# Altium integrated library Cap-Cer-SMD_V2.IntLib: 957 symbols (part 2 of 7) (continued)
## 3.3uF_1210N_16V_10%_X7R
designator C?  value 3.3uF  Voltage: 16V  Text1: 1210  (hidden comment: 3.3uF_1210N_16V_10%_X7R)
Cap Ceramic X7R; Manufacturer: Various; Part Number: 3.3uF 1210N 16V 10% X7R; EDM-PN: CAP1390; Tol: 10%; Package: CAPC1210X180N; Text2: *; SAAB PN: *; DCE Part No: *
footprint CAPC1210X180N (Chip Capacitor, 1210, 2-Leads, Body 3.2x2.5mm, IPC Medium Density)
pins: 1, 2

## 3.3uF_1210N_50V_10%_X7R
designator C?  value 3.3uF  Voltage: 50V  Text1: 1210  (hidden comment: 3.3uF_1210N_50V_10%_X7R)
Cap Ceramic X7R; Manufacturer: Various; Part Number: 3.3uF 1210N 50V 10% X7R; Tol: 10%; Package: CAPC1210X180N; EDM-PN: *; Text2: *; SAAB PN: *; DCE Part No: *
footprint CAPC1210X180N (Chip Capacitor, 1210, 2-Leads, Body 3.2x2.5mm, IPC Medium Density)
pins: 1, 2

## 3.6pF_0402N_50V_0.5pF_C0G/NP0
designator C?, comment value 3.6pF  Voltage: 50V  Text1: 0402  (hidden comment: 3.6pF_C0402_50V_0.5pF_C0G/NP0)
Cap Ceramic C0G/NP0; Manufacturer: Various; Part Number: 3.6pF 0402 50V 0.5pF C0G/NP0; EDM-PN: CAP934; Tol: 0.5pF; Package: CAPC0402X60N; Text2: *; SAAB PN: *; DCE Part No: *
footprint CAPC0402X60N (Chip Capacitor, 0402, 2-Leads, Body 1.0x0.5mm, IPC Medium Density)
pins: 1, 2

## 3.6pF_0603N_250V_0.1pF_C0G/NP0
designator C?, comment value 3.6pF  Voltage: 250V  Text1: 0603  (hidden comment: 251R14S3R6BV4T)
Cap Ceramic C0G/NP0; Manufacturer: Johanson; EDM-PN: CAP1326; Tol: 0.1pF; Part Number: 251R14S3R6BV4T; Package: CAPC0603X85N; Text2: *; SAAB PN: *; DCE Part No: *
footprint CAPC0603X85N (Chip Capacitor, 0603, 2-Leads, Body 1.6x0.8mm, IPC Medium Density)
pins: 1, 2

## 3.9nF_0402N_50V_10%_X7R
designator C?, comment value 3.9nF  Voltage: 50V  Text1: 0402  (hidden comment: 3.9nF_C0402_50V_10%_X7R)
Cap Ceramic X7R; Manufacturer: Various; Part Number: 3.9nF 0402 50V 10% X7R; Tol: 10%; Package: CAPC0402X60N; EDM-PN: *; Text2: *; SAAB PN: *; DCE Part No: *
footprint CAPC0402X60N (Chip Capacitor, 0402, 2-Leads, Body 1.0x0.5mm, IPC Medium Density)
pins: 1, 2

## 3.9nF_0603N_50V_5%_C0G/NP0
designator C?, comment value 3.9nF  Voltage: 50V  Text1: 0603  (hidden comment: 3.9nF_C0603_50V_5%_C0G/NP0)
Cap Ceramic C0G/NP0; Manufacturer: Various; Part Number: 3.9nF 0603 50V 5% C0G/NP0; EDM-PN: CAP1300; Tol: 5%; Package: CAPC0603X85N; Text2: *; SAAB PN: *; DCE Part No: *
footprint CAPC0603X85N (Chip Capacitor, 0603, 2-Leads, Body 1.6x0.8mm, IPC Medium Density)
pins: 1, 2

## 3.9nF_0603N_50V_10%_X7R
designator C?, comment value 3.9nF  Voltage: 50V  Text1: 0603  (hidden comment: 3.9nF_C0603_50V_10%_X7R)
Cap Ceramic X7R; Manufacturer: Various; Part Number: 3.9nF 0603 50V 10% X7R; Tol: 10%; Package: CAPC0603X85N; EDM-PN: *; Text2: *; SAAB PN: *; DCE Part No: *
footprint CAPC0603X85N (Chip Capacitor, 0603, 2-Leads, Body 1.6x0.8mm, IPC Medium Density)
pins: 1, 2

## 3.9nF_0805N_50V_10%_X7R
designator C?, comment value 3.9nF  Voltage: 50V  Text1: 0805  (hidden comment: 3.9nF_C0805_50V_10%_X7R)
Cap Ceramic X7R; Manufacturer: Various; Part Number: 3.9nF 0805 50V 10% X7R; Tol: 10%; Package: CAPC0805X110N; EDM-PN: *; Text2: *; SAAB PN: *; DCE Part No: *
footprint CAPC0805X110N (Chip Capacitor, 0805, 2-Leads, Body 2.0x1.3mm, IPC Medium Density)
pins: 1, 2

## 3.9pF_0402N_50V_5%_C0G/NP0
designator C?, comment value 3.9pF  Voltage: 50V  Text1: 0402  (hidden comment: 3.9pF_C0402_50V_5%_C0G/NP0)
Cap Ceramic C0G/NP0; Manufacturer: Various; Part Number: 3.9pF 0402 50V 5% C0G; Tol: 5%; Package: CAPC0402X60N; EDM-PN: *; Text2: *; SAAB PN: *; DCE Part No: *
footprint CAPC0402X60N (Chip Capacitor, 0402, 2-Leads, Body 1.0x0.5mm, IPC Medium Density)
pins: 1, 2

## 3.9pF_0603N_50V_5%_C0G/NP0
designator C?, comment value 3.9pF  Voltage: 50V  Text1: 0603  (hidden comment: 3.9pF_C0603_50V_5%_C0G/NP0)
Cap Ceramic C0G/NP0; Manufacturer: Various; Part Number: 3.9pF 0603 50V 5% C0G/NP0; Tol: 5%; Package: CAPC0603X85N; EDM-PN: *; Text2: *; SAAB PN: *; DCE Part No: *
footprint CAPC0603X85N (Chip Capacitor, 0603, 2-Leads, Body 1.6x0.8mm, IPC Medium Density)
pins: 1, 2

## 3.9pF_0805N_50V_5%_C0G/NP0
designator C?, comment value 3.9pF  Voltage: 50V  Text1: 0805  (hidden comment: 3.9pF_C0805_50V_5%_C0G/NP0)
Cap Ceramic C0G/NP0; Manufacturer: Various; Part Number: 3.9pF 0805 50V 5% C0G/NP0; Tol: 5%; Package: CAPC0805X110N; EDM-PN: *; Text2: *; SAAB PN: *; DCE Part No: *
footprint CAPC0805X110N (Chip Capacitor, 0805, 2-Leads, Body 2.0x1.3mm, IPC Medium Density)
pins: 1, 2

## 3pF_0402N_50V_0.25pF_C0G/NP0
designator C?, comment value 3pF  Voltage: 50V  Text1: 0402  (hidden comment: 3pF_C0402_50V_0.25p_C0G/NP0)
Cap Ceramic C0G/NP0; Manufacturer: Various; Part Number: 3pF 0402 50V 0.25pF C0G/NP0; EDM-PN: CAP935; Tol: 0.25pF; Package: CAPC0402X60N; Text2: *; SAAB PN: *; DCE Part No: *
footprint CAPC0402X60N (Chip Capacitor, 0402, 2-Leads, Body 1.0x0.5mm, IPC Medium Density)
pins: 1, 2

## 3pF_0402N_50V_0.25pF_C0G/NP0-GRM1555C
designator C?, comment value 3pF  Voltage: 50V  Text1: 0402  (hidden comment: GRM1555C1H3R0CA01D)
Cap Ceramic C0G/NP0; Manufacturer: Murata; Tol: 0.25pF; Part Number: GRM1555C1H3R0CA01D; Package: GRM155-0.20; EDM-PN: *; Text2: *; SAAB PN: *; DCE Part No: *
footprint GRM155-0.20 (GRM155 0402 1.0x0.5mm)
pins: 1, 2

## 3pF_0603N_200V_0.1pF_C0G/NP0-06032U3R0BAT2A
designator C?, comment value 3pF  Voltage: 200V  Text1: 0603  (hidden comment: 06032U3R0BAT2A)
Cap Ceramic C0G/NP0; Manufacturer: AVX; EDM-PN: CAP1248; Tol: 0.1pF; Part Number: 06032U3R0BAT2A; Package: CAPC0603X85N; Text2: *; SAAB PN: *; DCE Part No: *
footprint CAPC0603X85N (Chip Capacitor, 0603, 2-Leads, Body 1.6x0.8mm, IPC Medium Density)
pins: 1, 2

## 4.3pF_0402N_50V_5%_C0G/NP0
designator C?, comment value 4.3pF  Voltage: 50V  Text1: 0402  (hidden comment: 4.3pF_C0402_50V_5%_C0G/NP0)
Cap Ceramic C0G/NP0; Manufacturer: Various; Part Number: 4.3pF 0402 50V 5% C0G/NP0; Tol: 5%; Package: CAPC0402X60N; EDM-PN: *; Text2: *; SAAB PN: *; DCE Part No: *
footprint CAPC0402X60N (Chip Capacitor, 0402, 2-Leads, Body 1.0x0.5mm, IPC Medium Density)
pins: 1, 2

## 4.3pF_0603N_50V_5%_C0G/NP0
designator C?, comment value 4.3pF  Voltage: 50V  Text1: 0603  (hidden comment: 4.3pF_C0603_50V_5%_C0G/NP0)
Cap Ceramic C0G/NP0; Manufacturer: Various; Part Number: 4.3pF 0603 50V 5% C0G/NP0; EDM-PN: CAP1350; Tol: 5%; Package: CAPC0603X85N; Text2: *; SAAB PN: *; DCE Part No: *
footprint CAPC0603X85N (Chip Capacitor, 0603, 2-Leads, Body 1.6x0.8mm, IPC Medium Density)
pins: 1, 2

## 4.3pF_0805N_50V_5%_C0G/NP0
designator C?, comment value 4.3pF  Voltage: 50V  Text1: 0805  (hidden comment: 4.3pF_C0805_50V_5%_C0G/NP0)
Cap Ceramic C0G/NP0; Manufacturer: Various; Part Number: 4.3pF 0805 50V 5% C0G/NP0; Tol: 5%; Package: CAPC0805X110N; EDM-PN: *; Text2: *; SAAB PN: *; DCE Part No: *
footprint CAPC0805X110N (Chip Capacitor, 0805, 2-Leads, Body 2.0x1.3mm, IPC Medium Density)
pins: 1, 2

## 4.7nF_0201N_10V_10%_X5R
designator C?, comment value 4.7nF  Voltage: 10V  Text1: 0201  (hidden comment: 4.7nF_C0201_10V_10%_X5R)
Cap Ceramic X5R; Manufacturer: Various; Part Number: 4.7nF 0201 10V 10%_X5R; Tol: 10%; Package: CAPC0201X33N; EDM-PN: *; Text2: *; SAAB PN: *; DCE Part No: *
footprint CAPC0201X33N (Chip Capacitor, 0201, 2-Leads, Body 0.6x0.3mm, IPC Medium Density)
pins: 1, 2

## 4.7nF_0402N_50V_10%_X7R
designator C?, comment value 4.7nF  Voltage: 50V  Text1: 0402  (hidden comment: 4.7nF_C0402_50V_10%_X7R)
Cap Ceramic X7R; Manufacturer: Various; Part Number: 4.7nF 0402 50V 10% X7R; EDM-PN: CAP1039; Tol: 10%; Package: CAPC0402X60N; Text2: *; SAAB PN: *; DCE Part No: *
footprint CAPC0402X60N (Chip Capacitor, 0402, 2-Leads, Body 1.0x0.5mm, IPC Medium Density)
pins: 1, 2

## 4.7nF_0603N_50V_5%_X7R
designator C?, comment value 4.7nF  Voltage: 50V  Text1: 0603  (hidden comment: 4.7nF_C0603_50V_5%_X7R)
Cap Ceramic X7R; Manufacturer: Various; Part Number: 4.7nF 0603 50V 5% X7R; Tol: 5%; Reutech PN: 5910-CA-0464; Package: CAPC0603X85N; EDM-PN: *; Text2: *; SAAB PN: *; DCE Part No: *
footprint CAPC0603X85N (Chip Capacitor, 0603, 2-Leads, Body 1.6x0.8mm, IPC Medium Density)
pins: 1, 2

## 4.7nF_0603N_50V_10%_X7R
designator C?, comment value 4.7nF  Voltage: 50V  Text1: 0603  (hidden comment: 4.7nF_C0603_50V_10%_X7R)
Cap Ceramic X7R; Manufacturer: Various; Part Number: 4.7nF 0603 50V 10% X7R; Tol: 10%; Package: CAPC0603X85N; EDM-PN: *; Text2: *; SAAB PN: *; DCE Part No: *
footprint CAPC0603X85N (Chip Capacitor, 0603, 2-Leads, Body 1.6x0.8mm, IPC Medium Density)
pins: 1, 2

## 4.7nF_0603N_50V_10%_X7R-DNF
designator C?, comment value (4.7nF)  Voltage: 50V  Text1: 0603  (hidden comment: 4.7nF_C0603_50V_10%_X7R)
Cap Ceramic X7R - Do not Fit; Manufacturer: Various; Part Number: DNF - 4.7nF 0603 50V 10% X7R; Tol: 10%; Package: CAPC0603X85N; EDM-PN: *; Text2: *; SAAB PN: *; DCE Part No: *
footprint CAPC0603X85N (Chip Capacitor, 0603, 2-Leads, Body 1.6x0.8mm, IPC Medium Density)
pins: 1, 2

## 4.7nF_0603N_100V_5%_X7R
designator C?, comment value 4.7nF  Voltage: 100V  Text1: 0603  (hidden comment: 4.7nF_C0603_100V_5%_X7R)
Cap Ceramic X7R; Manufacturer: Various; Part Number: 4.7nF 0603 100V 5% X7R; Tol: 5%; Package: CAPC0603X85N; EDM-PN: *; Text2: *; SAAB PN: *; DCE Part No: *
footprint CAPC0603X85N (Chip Capacitor, 0603, 2-Leads, Body 1.6x0.8mm, IPC Medium Density)
pins: 1, 2

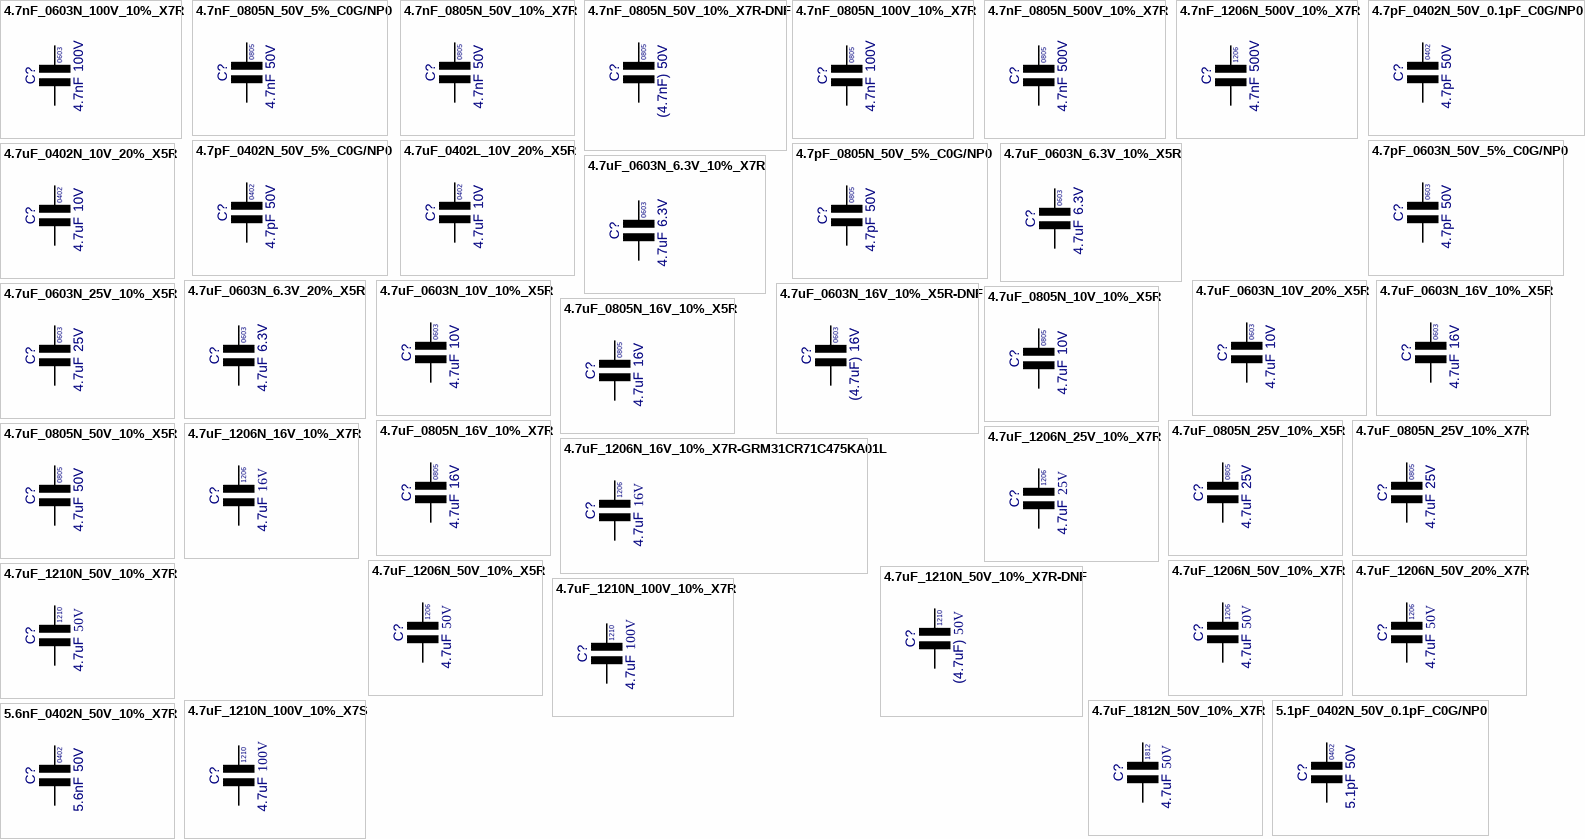
[diagram p6: symbols 4.7nF_0603N_100V_10%_X7R to 5.6nF_0402N_50V_10%_X7R]

## 4.7nF_0603N_100V_10%_X7R
designator C?, comment value 4.7nF  Voltage: 100V  Text1: 0603  (hidden comment: 4.7nF_C0603_100V_10%_X7R)
Cap Ceramic X7R; Manufacturer: Various; Part Number: 4.7nF 0603 100V 10% X7R; Tol: 10%; Package: CAPC0603X85N; EDM-PN: *; Text2: *; SAAB PN: *; DCE Part No: *
footprint CAPC0603X85N (Chip Capacitor, 0603, 2-Leads, Body 1.6x0.8mm, IPC Medium Density)
pins: 1, 2

## 4.7nF_0805N_50V_5%_C0G/NP0
designator C?, comment value 4.7nF  Voltage: 50V  Text1: 0805  (hidden comment: 4.7nF_C0805_50V_5%_C0G/NP0)
Cap Ceramic C0G/NP0; Manufacturer: Various; Part Number: 4.7nF 0805 50V 5% C0G/NP0; Tol: 5%; Package: CAPC0805X110N; EDM-PN: *; Text2: *; SAAB PN: *; DCE Part No: *
footprint CAPC0805X110N (Chip Capacitor, 0805, 2-Leads, Body 2.0x1.3mm, IPC Medium Density)
pins: 1, 2

## 4.7nF_0805N_50V_10%_X7R
designator C?, comment value 4.7nF  Voltage: 50V  Text1: 0805  (hidden comment: 4.7nF_C0805_50V_10%_X7R)
Cap Ceramic X7R; Manufacturer: Various; Part Number: 4.7nF 0805 50V 10% X7R; Tol: 10%; Package: CAPC0805X110N; EDM-PN: *; Text2: *; SAAB PN: *; DCE Part No: *
footprint CAPC0805X110N (Chip Capacitor, 0805, 2-Leads, Body 2.0x1.3mm, IPC Medium Density)
pins: 1, 2

## 4.7nF_0805N_50V_10%_X7R-DNF
designator C?, comment value (4.7nF)  Voltage: 50V  Text1: 0805  (hidden comment: 4.7nF_C0805_50V_10%_X7R-DNF)
Cap Ceramic X7R - Do not Fit; Manufacturer: Various; Part Number: DNF  - 4.7nF 0805 50V 10% X7R; Tol: 10%; Package: CAPC0805X110N; EDM-PN: *; Text2: *; SAAB PN: *; DCE Part No: *
footprint CAPC0805X110N (Chip Capacitor, 0805, 2-Leads, Body 2.0x1.3mm, IPC Medium Density)
pins: 1, 2

## 4.7nF_0805N_100V_10%_X7R
designator C?, comment value 4.7nF  Voltage: 100V  Text1: 0805  (hidden comment: 4.7nF_C0805_100V_10%_X7R)
Cap Ceramic X7R; Manufacturer: Various; Part Number: 4.7nF 0805 100V 10% X7R; Tol: 10%; Package: CAPC0805X110N; EDM-PN: *; Text2: *; SAAB PN: *; DCE Part No: *
footprint CAPC0805X110N (Chip Capacitor, 0805, 2-Leads, Body 2.0x1.3mm, IPC Medium Density)
pins: 1, 2

## 4.7nF_0805N_500V_10%_X7R
designator C?, comment value 4.7nF  Voltage: 500V  Text1: 0805  (hidden comment: 4.7nF_C0805_500V_10%_X7R)
Cap Ceramic X7R; Manufacturer: Various; Part Number: 4.7nF 0805 500V 10% X7R; Tol: 10%; Package: CAPC0805X110N; EDM-PN: *; Text2: *; SAAB PN: *; DCE Part No: *
footprint CAPC0805X110N (Chip Capacitor, 0805, 2-Leads, Body 2.0x1.3mm, IPC Medium Density)
pins: 1, 2

## 4.7nF_1206N_500V_10%_X7R
designator C?, comment value 4.7nF  Voltage: 500V  Text1: 1206  (hidden comment: 4.7nF_C1206_500V_10%_X7R)
Cap Ceramic X7R; Manufacturer: Various; Part Number: 4.7nF 1206 500V 10% X7R; Tol: 10%; Package: CAPC1206X135N; EDM-PN: *; Text2: *; SAAB PN: *; DCE Part No: *
footprint CAPC1206X135N (Chip Capacitor, 1206, 2-Leads, Body 3.2x1.6mm, IPC Medium Density)
pins: 1, 2

## 4.7pF_0402N_50V_0.1pF_C0G/NP0
designator C?, comment value 4.7pF  Voltage: 50V  Text1: 0402  (hidden comment: 4.7pF_C0402_50V_0.1pF_C0G/NP0)
Cap Ceramic C0G/NP0; Manufacturer: Various; Part Number: 4.7pF 0402 50V 0.1pF C0G/NP0; Tol: 0.1pF; Package: CAPC0402X60N; EDM-PN: *; Text2: *; SAAB PN: *; DCE Part No: *
footprint CAPC0402X60N (Chip Capacitor, 0402, 2-Leads, Body 1.0x0.5mm, IPC Medium Density)
pins: 1, 2

## 4.7pF_0402N_50V_5%_C0G/NP0
designator C?, comment value 4.7pF  Voltage: 50V  Text1: 0402  (hidden comment: 4.7pF_C0402_50V_5%_C0G/NP0)
Cap Ceramic C0G/NP0; Manufacturer: Various; Part Number: 4.7pF 0402 50V 5% C0G/NP0; Tol: 5%; Package: CAPC0402X60N; EDM-PN: *; Text2: *; SAAB PN: *; DCE Part No: *
footprint CAPC0402X60N (Chip Capacitor, 0402, 2-Leads, Body 1.0x0.5mm, IPC Medium Density)
pins: 1, 2

## 4.7pF_0603N_50V_5%_C0G/NP0
designator C?, comment value 4.7pF  Voltage: 50V  Text1: 0603  (hidden comment: 4.7pF_C0603_50V_5%_C0G/NP0)
Cap Ceramic C0G/NP0; Manufacturer: Various; Part Number: 4.7pF 0603 50V 5% C0G/NP0; EDM-PN: CAP844; Tol: 5%; Package: CAPC0603X85N; Text2: *; SAAB PN: *; DCE Part No: *
footprint CAPC0603X85N (Chip Capacitor, 0603, 2-Leads, Body 1.6x0.8mm, IPC Medium Density)
pins: 1, 2

## 4.7pF_0805N_50V_5%_C0G/NP0
designator C?, comment value 4.7pF  Voltage: 50V  Text1: 0805  (hidden comment: 4.7pF_C0805_50V_5%_C0G/NP0)
Cap Ceramic C0G/NP0; Manufacturer: Various; Part Number: 4.7pF 0805 50V 5% C0G/NP0; Tol: 5%; Package: CAPC0805X110N; EDM-PN: *; Text2: *; SAAB PN: *; DCE Part No: *
footprint CAPC0805X110N (Chip Capacitor, 0805, 2-Leads, Body 2.0x1.3mm, IPC Medium Density)
pins: 1, 2

## 4.7uF_0402L_10V_20%_X5R
designator C?, comment value 4.7uF  Voltage: 10V  Text1: 0402  (hidden comment: 4.7uF_C0402_10V_20%_X5R)
Cap Ceramic X5R; Manufacturer: Samsung; Part Number: CL05A475MP5NRNC; DCE Part No: 9509; EDM-PN: CAP1029; Tol: 20%; Package: CAPC0402X60L; Text2: *; SAAB PN: *
footprint CAPC0402X60L (Chip Capacitor, 0402, 2-Leads, Body 1.0x0.5mm, IPC High Density)
pins: 1, 2

## 4.7uF_0402N_10V_20%_X5R
designator C?, comment value 4.7uF  Voltage: 10V  Text1: 0402  (hidden comment: 4.7uF_C0402_10V_20%_X5R)
Cap Ceramic X5R; Manufacturer: Samsung; Part Number: CL05A475MP5NRNC; DCE Part No: 9509; EDM-PN: CAP1029; Tol: 20%; Package: CAPC0402X60N; Text2: *; SAAB PN: *
footprint CAPC0402X60N (Chip Capacitor, 0402, 2-Leads, Body 1.0x0.5mm, IPC Medium Density)
pins: 1, 2

## 4.7uF_0603N_6.3V_10%_X5R
designator C?, comment value 4.7uF  Voltage: 6.3V  Text1: 0603  (hidden comment: 4.7uF_C0603_6.3V_10%_X5R)
Cap Ceramic X5R; Manufacturer: Various; Part Number: 4.7uF 0603 6.3V 10% X5R; DCE Part No: 9510; Tol: 20%; Reutech PN: 5910-CA-0531; Package: CAPC0603X85N; EDM-PN: *; Text2: *; SAAB PN: *
footprint CAPC0603X85N (Chip Capacitor, 0603, 2-Leads, Body 1.6x0.8mm, IPC Medium Density)
pins: 1, 2

## 4.7uF_0603N_6.3V_10%_X7R
designator C?, comment value 4.7uF  Voltage: 6.3V  Text1: 0603  (hidden comment: 4.7uF_C0603_6.3V_10%_X7R)
Cap Ceramic X7R; Manufacturer: Various; Part Number: 4.7uF 0603 6.3V 10% X7R; Tol: 20%; Reutech PN: 5910-CA-0531; Package: CAPC0603X85N; EDM-PN: *; Text2: *; SAAB PN: *; DCE Part No: *
footprint CAPC0603X85N (Chip Capacitor, 0603, 2-Leads, Body 1.6x0.8mm, IPC Medium Density)
pins: 1, 2

## 4.7uF_0603N_6.3V_20%_X5R
designator C?, comment value 4.7uF  Voltage: 6.3V  Text1: 0603  (hidden comment: 4.7uF_C0603_6.3V_20%_X5R)
Cap Ceramic X5R; Manufacturer: Various; Part Number: 4.7uF 0603 6.3V 20% X5R; EDM-PN: CAP1247; Tol: 20%; Package: CAPC0603X85N; Text2: *; SAAB PN: *; DCE Part No: *
footprint CAPC0603X85N (Chip Capacitor, 0603, 2-Leads, Body 1.6x0.8mm, IPC Medium Density)
pins: 1, 2

## 4.7uF_0603N_10V_10%_X5R
designator C?, comment value 4.7uF  Voltage: 10V  Text1: 0603  (hidden comment: 4.7uF_C0603_10V_10%_X5R)
Cap Ceramic X5R; Manufacturer: Various; Part Number: 4.7uF 0603 10V 10% X5R; DCE Part No: 9509; EDM-PN: CAP429; Tol: 10%; Package: CAPC0603X85N; Text2: *; SAAB PN: *
footprint CAPC0603X85N (Chip Capacitor, 0603, 2-Leads, Body 1.6x0.8mm, IPC Medium Density)
pins: 1, 2

## 4.7uF_0603N_10V_20%_X5R
designator C?, comment value 4.7uF  Voltage: 10V  Text1: 0603  (hidden comment: 4.7uF_C0603_10V_20%_X5R)
Cap Ceramic X5R; Manufacturer: Various; Part Number: 4.7uF 0603 10V 10% X5R; Tol: 20%; Package: CAPC0603X85N; EDM-PN: *; Text2: *; SAAB PN: *; DCE Part No: *
footprint CAPC0603X85N (Chip Capacitor, 0603, 2-Leads, Body 1.6x0.8mm, IPC Medium Density)
pins: 1, 2

## 4.7uF_0603N_16V_10%_X5R
designator C?, comment value 4.7uF  Voltage: 16V  Text1: 0603  (hidden comment: 4.7uF_C0603_16V_10%_X5R)
Cap Ceramic X5R; Manufacturer: Various; Part Number: 4.7uF 0603 16V 10% X5R; EDM-PN: CAP967; Tol: 10%; Package: CAPC0603X85N; Text2: *; SAAB PN: *; DCE Part No: *
footprint CAPC0603X85N (Chip Capacitor, 0603, 2-Leads, Body 1.6x0.8mm, IPC Medium Density)
pins: 1, 2

## 4.7uF_0603N_16V_10%_X5R-DNF
designator C?, comment value (4.7uF)  Voltage: 16V  Text1: 0603  (hidden comment: 4.7uF_C0603_16V_10%_X5R)
Cap Ceramic X5R - Do not Fit; Manufacturer: Various; Part Number: DNF - 4.7uF 0603 16V 10% X5R; EDM-PN: CAP967; Tol: 10%; Package: CAPC0603X85N; Text2: *; SAAB PN: *; DCE Part No: *
footprint CAPC0603X85N (Chip Capacitor, 0603, 2-Leads, Body 1.6x0.8mm, IPC Medium Density)
pins: 1, 2

## 4.7uF_0603N_25V_10%_X5R
designator C?, comment value 4.7uF  Voltage: 25V  Text1: 0603  (hidden comment: 4.7uF_C0603_25V_10%_X5R)
Cap Ceramic X5R; Manufacturer: Various; Part Number: 4.7uF 0603 25V 10% X5R; EDM-PN: CAP1302; Tol: 10%; Package: CAPC0603X85N; Text2: *; SAAB PN: *; DCE Part No: *
footprint CAPC0603X85N (Chip Capacitor, 0603, 2-Leads, Body 1.6x0.8mm, IPC Medium Density)
pins: 1, 2

## 4.7uF_0805N_10V_10%_X5R
designator C?, comment value 4.7uF  Voltage: 10V  Text1: 0805  (hidden comment: 4.7uF_C0805_10V_10%_X5R)
Cap Ceramic X5R; Manufacturer: Various; Part Number: 4.7uF 0805 10V 10% X5R; Tol: 10%; Reutech PN: 5910-CA-0468; Package: CAPC0805X110N; EDM-PN: *; Text2: *; SAAB PN: *; DCE Part No: *
footprint CAPC0805X110N (Chip Capacitor, 0805, 2-Leads, Body 2.0x1.3mm, IPC Medium Density)
pins: 1, 2

## 4.7uF_0805N_16V_10%_X5R
designator C?, comment value 4.7uF  Voltage: 16V  Text1: 0805  (hidden comment: 4.7uF_C0805_16V_10%_X5R)
Cap Ceramic X5R; Manufacturer: Various; Part Number: 4.7uF 0805 16V 10% X5R; EDM-PN: CAP220; Tol: 10%; Package: CAPC0805X110N; Text2: *; SAAB PN: *; DCE Part No: *
footprint CAPC0805X110N (Chip Capacitor, 0805, 2-Leads, Body 2.0x1.3mm, IPC Medium Density)
pins: 1, 2

## 4.7uF_0805N_16V_10%_X7R
designator C?, comment value 4.7uF  Voltage: 16V  Text1: 0805  (hidden comment: 4.7uF_C0805_16V_10%_X7R)
Cap Ceramic X7R; Manufacturer: Various; Part Number: 4.7uF 0805 16V 10% X7R; EDM-PN: CAP404; Tol: 10%; Package: CAPC0805X110N; Text2: *; SAAB PN: *; DCE Part No: *
footprint CAPC0805X110N (Chip Capacitor, 0805, 2-Leads, Body 2.0x1.3mm, IPC Medium Density)
pins: 1, 2

## 4.7uF_0805N_25V_10%_X5R
designator C?, comment value 4.7uF  Voltage: 25V  Text1: 0805  (hidden comment: 4.7uF_C0805_25V_10%_X5R)
Cap Ceramic X5R; Manufacturer: Various; Part Number: 4.7uF 0805 25V 10% X5R; Tol: 10%; Reutech PN: 5910-CA-0483; Package: CAPC0805X110N; EDM-PN: *; Text2: *; SAAB PN: *; DCE Part No: *
footprint CAPC0805X110N (Chip Capacitor, 0805, 2-Leads, Body 2.0x1.3mm, IPC Medium Density)
pins: 1, 2

## 4.7uF_0805N_25V_10%_X7R
designator C?, comment value 4.7uF  Voltage: 25V  Text1: 0805  (hidden comment: 4.7uF_C0805_25V_10%_X7R)
Cap Ceramic X7R; Manufacturer: Various; Part Number: 4.7uF 0805 25V 10% X7R; EDM-PN: CAP544; Tol: 10%; Package: CAPC0805X110N; Text2: *; SAAB PN: *; DCE Part No: *
footprint CAPC0805X110N (Chip Capacitor, 0805, 2-Leads, Body 2.0x1.3mm, IPC Medium Density)
pins: 1, 2

## 4.7uF_0805N_50V_10%_X5R
designator C?, comment value 4.7uF  Voltage: 50V  Text1: 0805  (hidden comment: 4.7uF_C0805_50V_10%_X5R)
Cap Ceramic X5R; Manufacturer: Various; Part Number: 4.7uF 0805 50V 10% X5R; EDM-PN: CAP787; Tol: 10%; Package: CAPC0805X110N; Text2: *; SAAB PN: *; DCE Part No: *
footprint CAPC0805X110N (Chip Capacitor, 0805, 2-Leads, Body 2.0x1.3mm, IPC Medium Density)
pins: 1, 2

## 4.7uF_1206N_16V_10%_X7R
designator C?, comment value 4.7uF  Voltage: 16V  Text1: 1206  (hidden comment: 4.7uF_C1206_16V_10%_X7R)
Cap Ceramic X7R; Manufacturer: Various; Part Number: 4.7uF 1206 16V 10% X7R; Tol: 10%; Reutech PN: 5910-CA-0445; Package: CAPC1206X135N; EDM-PN: *; Text2: *; SAAB PN: *; DCE Part No: *
footprint CAPC1206X135N (Chip Capacitor, 1206, 2-Leads, Body 3.2x1.6mm, IPC Medium Density)
pins: 1, 2

## 4.7uF_1206N_16V_10%_X7R-GRM31CR71C475KA01L
designator C?, comment value 4.7uF  Voltage: 16V  Text1: 1206  (hidden comment: GRM31CR71C475KA01L)
Cap Ceramic X7R; Manufacturer: Murata; Tol: 10%; Reutech PN: 5910-CA-0445; Part Number: GRM31CR71C475KA01L; Package: CAPC1206X135N; EDM-PN: *; Text2: *; SAAB PN: *; DCE Part No: *
footprint CAPC1206X135N (Chip Capacitor, 1206, 2-Leads, Body 3.2x1.6mm, IPC Medium Density)
pins: 1, 2

## 4.7uF_1206N_25V_10%_X7R
designator C?, comment value 4.7uF  Voltage: 25V  Text1: 1206  (hidden comment: 4.7uF_C1206_25V_10%_X7R)
Cap Ceramic X7R; Manufacturer: Various; Part Number: 4.7uF 1206 25V 10% X7R; Tol: 10%; Reutech PN: 5910-CA-0564; Package: CAPC1206X135N; EDM-PN: *; Text2: *; SAAB PN: *; DCE Part No: *
footprint CAPC1206X135N (Chip Capacitor, 1206, 2-Leads, Body 3.2x1.6mm, IPC Medium Density)
pins: 1, 2

## 4.7uF_1206N_50V_10%_X5R
designator C?, comment value 4.7uF  Voltage: 50V  Text1: 1206  (hidden comment: 4.7uF_C1206_50V_10%_X5R)
Cap Ceramic X5R; Manufacturer: Various; Part Number: 4.7uF 1206 50V 10% X5R; EDM-PN: CAP570; Tol: 10%; Package: CAPC1206X135N; Text2: *; SAAB PN: *; DCE Part No: *
footprint CAPC1206X135N (Chip Capacitor, 1206, 2-Leads, Body 3.2x1.6mm, IPC Medium Density)
pins: 1, 2

## 4.7uF_1206N_50V_10%_X7R
designator C?, comment value 4.7uF  Voltage: 50V  Text1: 1206  (hidden comment: 4.7uF_C1206_50V_10%_X7R)
Cap Ceramic X7R; Manufacturer: Various; Part Number: 4.7uF 1206 50V 10% X7R; Tol: 10%; Reutech PN: 5910-CA-0445; Package: CAPC1206X135N; EDM-PN: *; Text2: *; SAAB PN: *; DCE Part No: *
footprint CAPC1206X135N (Chip Capacitor, 1206, 2-Leads, Body 3.2x1.6mm, IPC Medium Density)
pins: 1, 2

## 4.7uF_1206N_50V_20%_X7R
designator C?, comment value 4.7uF  Voltage: 50V  Text1: 1206  (hidden comment: 4.7uF_C1206_50V_20%_X7R)
Cap Ceramic X7R; Manufacturer: Various; Part Number: 4.7uF 1206 50V 20% X7R; Tol: 20%; Reutech PN: 5910-CA-0561; Package: CAPC1206X135N; EDM-PN: *; Text2: *; SAAB PN: *; DCE Part No: *
footprint CAPC1206X135N (Chip Capacitor, 1206, 2-Leads, Body 3.2x1.6mm, IPC Medium Density)
pins: 1, 2

## 4.7uF_1210N_50V_10%_X7R
designator C?, comment value 4.7uF  Voltage: 50V  Text1: 1210  (hidden comment: 4.7uF_C1210_50V_10%_X7R)
Cap Ceramic X7R; Manufacturer: Various; Part Number: 4.7uF 1210 50V 10% X7R; Tol: 10%; Package: CAPC1210X250N; EDM-PN: *; Text2: *; SAAB PN: *; DCE Part No: *
footprint CAPC1210X250N (Chip Capacitor, 1210, 2-Leads, Body 3.2x2.5mm, IPC Medium Density)
pins: 1, 2

## 4.7uF_1210N_50V_10%_X7R-DNF
designator C?, comment value (4.7uF)  Voltage: 50V  Text1: 1210  (hidden comment: 4.7uF_C1210_50V_10%_X7R)
Cap Ceramic X7R - Do not Fit; Manufacturer: Various; Part Number: DNF - 4.7uF 1210 50V 10% X7R; Tol: 10%; Package: CAPC1210X250N; EDM-PN: *; Text2: *; SAAB PN: *; DCE Part No: *
footprint CAPC1210X250N (Chip Capacitor, 1210, 2-Leads, Body 3.2x2.5mm, IPC Medium Density)
pins: 1, 2

## 4.7uF_1210N_100V_10%_X7R
designator C?, comment value 4.7uF  Voltage: 100V  Text1: 1210  (hidden comment: 4.7uF_C1210_100V_10%_X7R)
Cap Ceramic X7R; Manufacturer: Various; Part Number: 4.7uF 1210 100V 10% X7R; Tol: 10%; Package: CAPC1210X250N; EDM-PN: *; Text2: *; SAAB PN: *; DCE Part No: *
footprint CAPC1210X250N (Chip Capacitor, 1210, 2-Leads, Body 3.2x2.5mm, IPC Medium Density)
pins: 1, 2

## 4.7uF_1210N_100V_10%_X7S
designator C?, comment value 4.7uF  Voltage: 100V  Text1: 1210  (hidden comment: 4.7uF_C1210_100V_10%_X7S)
Cap Ceramic X7S; Manufacturer: Various; Part Number: 4.7uF 1210 100V 10% X7S; Tol: 10%; Package: CAPC1210X250N; EDM-PN: *; Text2: *; SAAB PN: *; DCE Part No: *
footprint CAPC1210X250N (Chip Capacitor, 1210, 2-Leads, Body 3.2x2.5mm, IPC Medium Density)
pins: 1, 2

## 4.7uF_1812N_50V_10%_X7R
designator C?, comment value 4.7uF  Voltage: 50V  Text1: 1812  (hidden comment: 4.7uF_C1812_50V_10%_X7R)
Cap Ceramic X7R; Manufacturer: Various; Part Number: 4.7uF 1812 50V 10% X7R; Tol: 10%; Reutech PN: 5910-CA-0551; Package: CAPC1812X135N; EDM-PN: *; Text2: *; SAAB PN: *; DCE Part No: *
footprint CAPC1812X135N (Chip Capacitor, 1812, 2-Leads, Body 4.5x3.2mm, IPC Medium Density)
pins: 1, 2

## 5.1pF_0402N_50V_0.1pF_C0G/NP0
designator C?, comment value 5.1pF  Voltage: 50V  Text1: 0402  (hidden comment: 5.1pF_C0402_50V_0.1pF_C0G/NP0)
Cap Ceramic C0G/NP0; Manufacturer: Various; Part Number: 5.1pF 0402 50V 0.1pF C0G/NP0; Tol: 0.1pF; Package: CAPC0402X60N; EDM-PN: *; Text2: *; SAAB PN: *; DCE Part No: *
footprint CAPC0402X60N (Chip Capacitor, 0402, 2-Leads, Body 1.0x0.5mm, IPC Medium Density)
pins: 1, 2

## 5.6nF_0402N_50V_10%_X7R
designator C?, comment value 5.6nF  Voltage: 50V  Text1: 0402  (hidden comment: 5.6nF_C0402_50V_10%_X7R)
Cap Ceramic X7R; Manufacturer: Various; Part Number: 5.6nF 0402 50V 10% X7R; Tol: 10%; Package: CAPC0402X60N; EDM-PN: *; Text2: *; SAAB PN: *; DCE Part No: *
footprint CAPC0402X60N (Chip Capacitor, 0402, 2-Leads, Body 1.0x0.5mm, IPC Medium Density)
pins: 1, 2

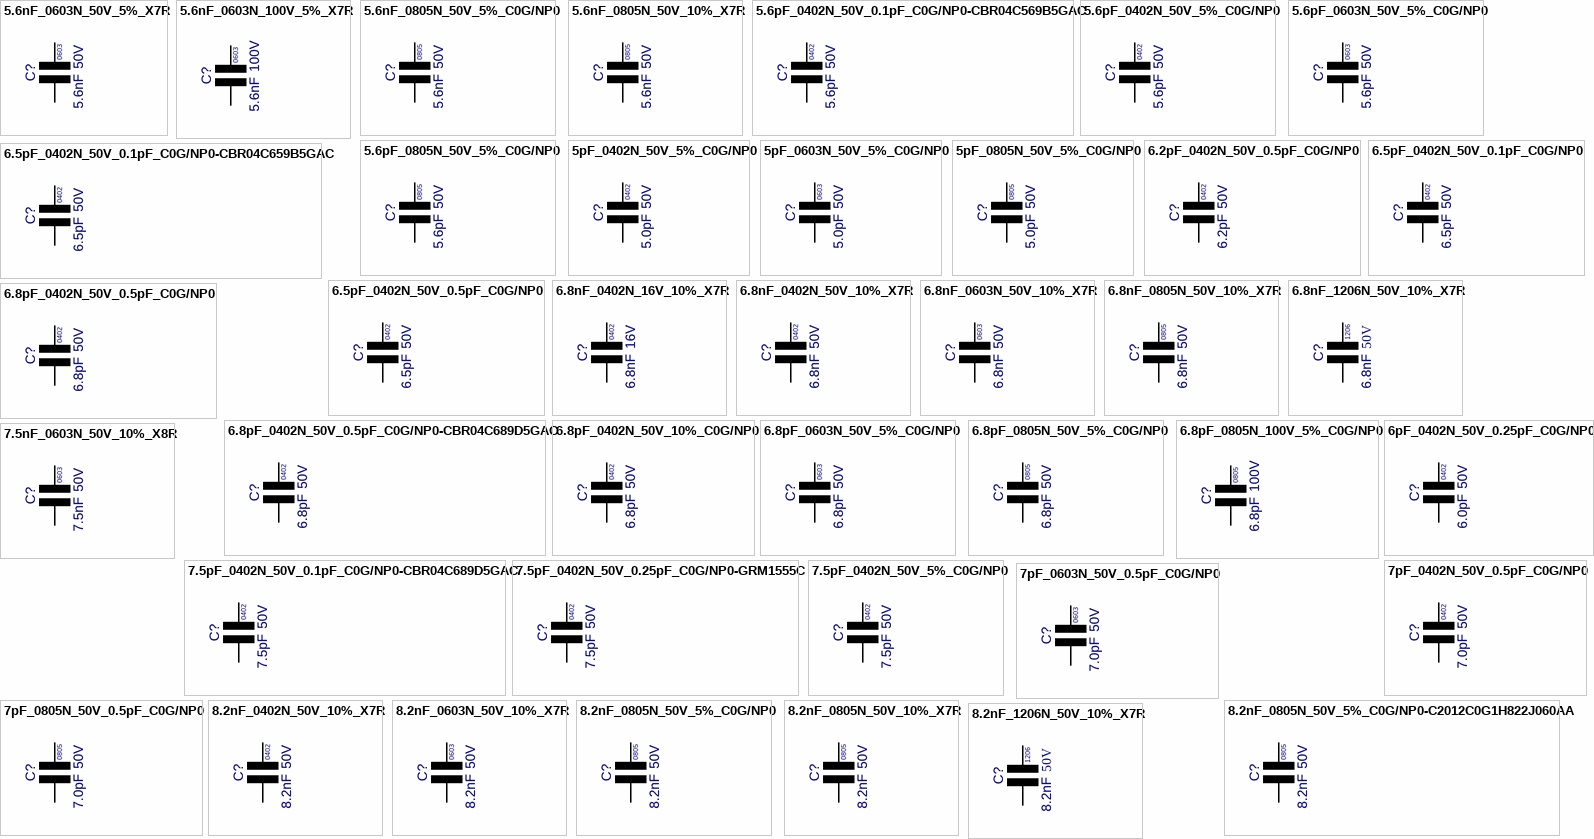
[diagram p7: symbols 5.6nF_0603N_50V_5%_X7R to 8.2nF_1206N_50V_10%_X7R]

## 5.6nF_0603N_50V_5%_X7R
designator C?, comment value 5.6nF  Voltage: 50V  Text1: 0603  (hidden comment: 5.6nF_C0603_50V_5%_X7R)
Cap Ceramic X7R; Manufacturer: Various; Part Number: 5.6nF 0603 50V 5% X7R; Tol: 5%; Package: CAPC0603X85N; EDM-PN: *; Text2: *; SAAB PN: *; DCE Part No: *
footprint CAPC0603X85N (Chip Capacitor, 0603, 2-Leads, Body 1.6x0.8mm, IPC Medium Density)
pins: 1, 2

## 5.6nF_0603N_100V_5%_X7R
designator C?, comment value 5.6nF  Voltage: 100V  Text1: 0603  (hidden comment: 5.6nF_C0603_100V_5%_X7R)
Cap Ceramic X7R; Manufacturer: Various; Part Number: 5.6nF 0603 100V 5% X7R; Tol: 5%; Reutech PN: 5910-CA-0466; Package: CAPC0603X85N; EDM-PN: *; Text2: *; SAAB PN: *; DCE Part No: *
footprint CAPC0603X85N (Chip Capacitor, 0603, 2-Leads, Body 1.6x0.8mm, IPC Medium Density)
pins: 1, 2

## 5.6nF_0805N_50V_5%_C0G/NP0
designator C?, comment value 5.6nF  Voltage: 50V  Text1: 0805  (hidden comment: 5.6nF_C0805_50V_5%_C0G/NP0)
Cap Ceramic C0G/NP0; Manufacturer: Various; Part Number: 5.6nF 0805 50V 5% C0G/NP0; Tol: 5%; Package: CAPC0805X110N; EDM-PN: *; Text2: *; SAAB PN: *; DCE Part No: *
footprint CAPC0805X110N (Chip Capacitor, 0805, 2-Leads, Body 2.0x1.3mm, IPC Medium Density)
pins: 1, 2

## 5.6nF_0805N_50V_10%_X7R
designator C?, comment value 5.6nF  Voltage: 50V  Text1: 0805  (hidden comment: 5.6nF_C0805_50V_10%_X7R)
Cap Ceramic X7R; Manufacturer: Various; Part Number: 5.6nF 0805 50V 10% X7R; Tol: 10%; Package: CAPC0805X110N; EDM-PN: *; Text2: *; SAAB PN: *; DCE Part No: *
footprint CAPC0805X110N (Chip Capacitor, 0805, 2-Leads, Body 2.0x1.3mm, IPC Medium Density)
pins: 1, 2

## 5.6pF_0402N_50V_0.1pF_C0G/NP0-CBR04C569B5GAC
designator C?, comment value 5.6pF  Voltage: 50V  Text1: 0402  (hidden comment: CBR04C569B5GAC)
Cap Ceramic C0G/NP0 HiQ-CBR Series for RF; Manufacturer: Kemet; EDM-PN: CAP1406; Tol: 0.1pF; Part Number: CBR04C569B5GAC; Package: CAPC0402X60N; Text2: *; SAAB PN: *; DCE Part No: *
footprint CAPC0402X60N (Chip Capacitor, 0402, 2-Leads, Body 1.0x0.5mm, IPC Medium Density)
pins: 1, 2

## 5.6pF_0402N_50V_5%_C0G/NP0
designator C?, comment value 5.6pF  Voltage: 50V  Text1: 0402  (hidden comment: 5.6pF_C0402_50V_5%_C0G/NP0)
Cap Ceramic C0G/NP0; Manufacturer: Various; Part Number: 5.6pF 0402 50V 5% C0G/NP0; EDM-PN: CAP1257; Tol: 5%; Package: CAPC0402X60N; Text2: *; SAAB PN: *; DCE Part No: *
footprint CAPC0402X60N (Chip Capacitor, 0402, 2-Leads, Body 1.0x0.5mm, IPC Medium Density)
pins: 1, 2

## 5.6pF_0603N_50V_5%_C0G/NP0
designator C?, comment value 5.6pF  Voltage: 50V  Text1: 0603  (hidden comment: 5.6pF_C0603_50V_5%_C0G/NP0)
Cap Ceramic C0G/NP0; Manufacturer: Various; Part Number: 5.6pF 0603 50V 5% C0G/NP0; Tol: 5%; Package: CAPC0603X85N; EDM-PN: *; Text2: *; SAAB PN: *; DCE Part No: *
footprint CAPC0603X85N (Chip Capacitor, 0603, 2-Leads, Body 1.6x0.8mm, IPC Medium Density)
pins: 1, 2

## 5.6pF_0805N_50V_5%_C0G/NP0
designator C?, comment value 5.6pF  Voltage: 50V  Text1: 0805  (hidden comment: 5.6pF_C0805_50V_5%_C0G/NP0)
Cap Ceramic C0G/NP0; Manufacturer: Various; Part Number: 5.6pF 0805 50V 5% C0G/NP0; Tol: 5%; Package: CAPC0805X110N; EDM-PN: *; Text2: *; SAAB PN: *; DCE Part No: *
footprint CAPC0805X110N (Chip Capacitor, 0805, 2-Leads, Body 2.0x1.3mm, IPC Medium Density)
pins: 1, 2

## 5pF_0402N_50V_5%_C0G/NP0
designator C?, comment value 5.0pF  Voltage: 50V  Text1: 0402  (hidden comment: 5pF_C0402_50V_5%_C0G/NP0)
Cap Ceramic C0G/NP0; Manufacturer: Various; Part Number: 5.0pF 0402 50V 5% C0G/NP0; Tol: 5%; Package: CAPC0402X60N; EDM-PN: *; Text2: *; SAAB PN: *; DCE Part No: *
footprint CAPC0402X60N (Chip Capacitor, 0402, 2-Leads, Body 1.0x0.5mm, IPC Medium Density)
pins: 1, 2

## 5pF_0603N_50V_5%_C0G/NP0
designator C?, comment value 5.0pF  Voltage: 50V  Text1: 0603  (hidden comment: 5pF_C0603_50V_5%_C0G/NP0)
Cap Ceramic C0G/NP0; Manufacturer: Various; Part Number: 5.0pF 0603 50V 5% C0G/NP0; Tol: 5%; Package: CAPC0603X85N; EDM-PN: *; Text2: *; SAAB PN: *; DCE Part No: *
footprint CAPC0603X85N (Chip Capacitor, 0603, 2-Leads, Body 1.6x0.8mm, IPC Medium Density)
pins: 1, 2

## 5pF_0805N_50V_5%_C0G/NP0
designator C?, comment value 5.0pF  Voltage: 50V  Text1: 0805  (hidden comment: 5pF_C0805_50V_5%_C0G/NP0)
Cap Ceramic C0G/NP0; Manufacturer: Various; Part Number: 5.0pF 0805 50V 5% C0G/NP0; Tol: 5%; Package: CAPC0805X110N; EDM-PN: *; Text2: *; SAAB PN: *; DCE Part No: *
footprint CAPC0805X110N (Chip Capacitor, 0805, 2-Leads, Body 2.0x1.3mm, IPC Medium Density)
pins: 1, 2

## 6.2pF_0402N_50V_0.5pF_C0G/NP0
designator C?, comment value 6.2pF  Voltage: 50V  Text1: 0402  (hidden comment: 6.2pF_C0402_50V_0.5pF_C0G/NP0)
Cap Ceramic C0G/NP0; Manufacturer: Various; Part Number: 6.2pF 0402 50V 0.5pF C0G/NP0; EDM-PN: CAP936; Tol: 0.5pF; Package: CAPC0402X60N; Text2: *; SAAB PN: *; DCE Part No: *
footprint CAPC0402X60N (Chip Capacitor, 0402, 2-Leads, Body 1.0x0.5mm, IPC Medium Density)
pins: 1, 2

## 6.5pF_0402N_50V_0.1pF_C0G/NP0
designator C?, comment value 6.5pF  Voltage: 50V  Text1: 0402  (hidden comment: 6.5pF_C0402_50V_0.1pF_C0G/NP0)
Cap Ceramic C0G/NP0; Manufacturer: Various; Part Number: 6.5pF 0402 50V 0.1pF C0G/NP0; EDM-PN: CAP1392; Tol: 0.1pF; Package: CAPC0402X60N; Text2: *; SAAB PN: *; DCE Part No: *
footprint CAPC0402X60N (Chip Capacitor, 0402, 2-Leads, Body 1.0x0.5mm, IPC Medium Density)
pins: 1, 2

## 6.5pF_0402N_50V_0.1pF_C0G/NP0-CBR04C659B5GAC
designator C?, comment value 6.5pF  Voltage: 50V  Text1: 0402  (hidden comment: CBR04C659B5GAC)
Cap Ceramic C0G/NP0 HiQ-CBR Series for RF; Manufacturer: Kemet; EDM-PN: CAP1410; Tol: 0.1pF; Part Number: CBR04C659B5GAC; Package: CAPC0402X60N; Text2: *; SAAB PN: *; DCE Part No: *
footprint CAPC0402X60N (Chip Capacitor, 0402, 2-Leads, Body 1.0x0.5mm, IPC Medium Density)
pins: 1, 2

## 6.5pF_0402N_50V_0.5pF_C0G/NP0
designator C?, comment value 6.5pF  Voltage: 50V  Text1: 0402  (hidden comment: 6.5pF_C0402_50V_0.5pF_C0G/NP0)
Cap Ceramic C0G/NP0; Manufacturer: Various; Part Number: 6.5pF 0402 50V 0.5pF C0G/NP0; EDM-PN: CAP936; Tol: 0.5pF; Package: CAPC0402X60N; Text2: *; SAAB PN: *; DCE Part No: *
footprint CAPC0402X60N (Chip Capacitor, 0402, 2-Leads, Body 1.0x0.5mm, IPC Medium Density)
pins: 1, 2